# Altium footprint library LPHS-08-16-L-VP1-GP-REV_2.PcbLib: 1 footprints
Each footprint in its own frame and in the unit in brackets; x right, y up, seen from the top. Pads: shape width x height; smd on the part's side, far side on the other; paste and mask are expansions set on the pad; w line width, h text height; cw(c..) or ccw(c..) is an arc to the next point about the centre after c.
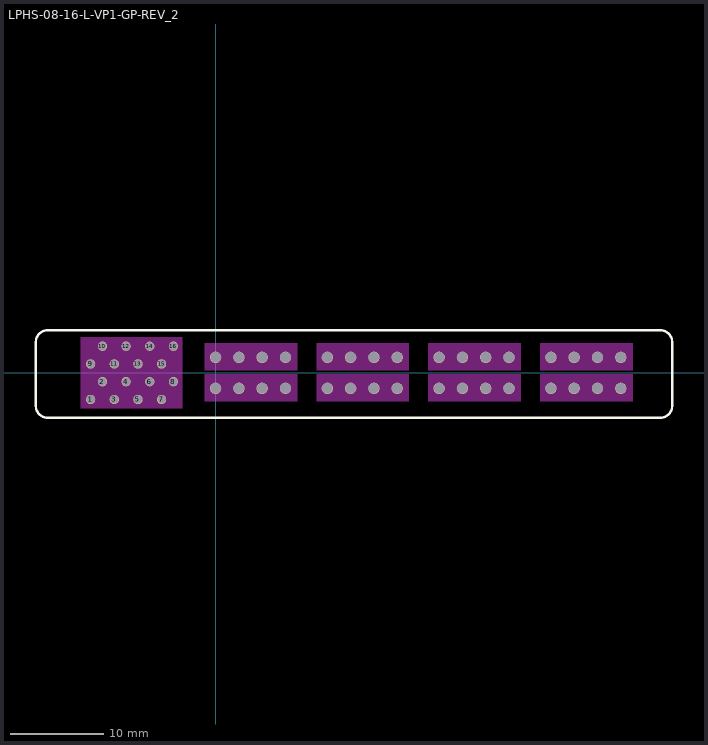
[diagram p0: the footprint, top view; thin cyan lines are the x and y axes]

## LPHS-08-16-L-VP1-GP-REV_2 [mm]
pads (48):
  round 1 hole 0.92: 1(-13.42,-2.858) 2(-12.15,-0.953) 3(-10.88,-2.858) 4(-9.61,-0.953) 5(-8.34,-2.858) 6(-7.07,-0.953) 7(-5.8,-2.858) 8(-4.53,-0.953) 9(-13.42,0.953) 10(-12.15,2.857) 11(-10.88,0.953) 12(-9.61,2.857) 13(-8.34,0.953) 14(-7.07,2.857) 15(-5.8,0.953) 16(-4.53,2.857)
  round 1.22 hole 1.14: P01(0,-1.665) P01(2.5,-1.665) P01(5,-1.665) P01(7.5,-1.665) P02(0,1.665) P02(2.5,1.665) P02(5,1.665) P02(7.5,1.665) P03(12,-1.665) P03(14.5,-1.665) P03(17,-1.665) P03(19.5,-1.665) P04(12,1.665) P04(14.5,1.665) P04(17,1.665) P04(19.5,1.665) P05(24,-1.665) P05(26.5,-1.665) P05(29,-1.665) P05(31.5,-1.665) P06(24,1.665) P06(26.5,1.665) P06(29,1.665) P06(31.5,1.665) P07(36,-1.665) P07(38.5,-1.665) P07(41,-1.665) P07(43.5,-1.665) P08(36,1.665) P08(38.5,1.665) P08(41,1.665) P08(43.5,1.665)
Top Overlay:
  lines w0.254: -19.304,-3.556 ccw(c-18.034,-3.556) -18.034,-4.826 43.688,-4.826 47.752,-4.826 ccw(c47.752,-3.556) 49.022,-3.556 49.022,0.508 49.022,3.302 ccw(c47.752,3.302) 47.752,4.572 -14.478,4.572 -18.034,4.572 ccw(c-18.034,3.302) -19.304,3.302 -19.304,0.762 -19.304,-3.556
Keep-Out Layer:
  region: -14.478,3.81 -3.556,3.81 -3.556,-3.81 -14.478,-3.81
  region: -1.143,3.175 8.763,3.175 8.763,0.254 -1.143,0.254
  region: -1.143,-0.155 8.763,-0.155 8.763,-3.076 -1.143,-3.076
  region: 10.857,-0.155 20.763,-0.155 20.763,-3.076 10.857,-3.076
  region: 10.857,3.175 20.763,3.175 20.763,0.254 10.857,0.254
  region: 22.857,3.175 32.763,3.175 32.763,0.254 22.857,0.254
  region: 22.857,-0.155 32.763,-0.155 32.763,-3.076 22.857,-3.076
  region: 34.857,3.175 44.763,3.175 44.763,0.254 34.857,0.254
  region: 34.857,-0.155 44.763,-0.155 44.763,-3.076 34.857,-3.076
3D body "v24 with guide rails.stp": height 127.29, standoff -2.47, extent -60.677,-21.036 80.743,12.446